# Altium schematic symbol library NXP_60_26022015.SCHLIB: 1306 symbols (part 16 of 28) (continued)
## LPC1850FET180 (continued)
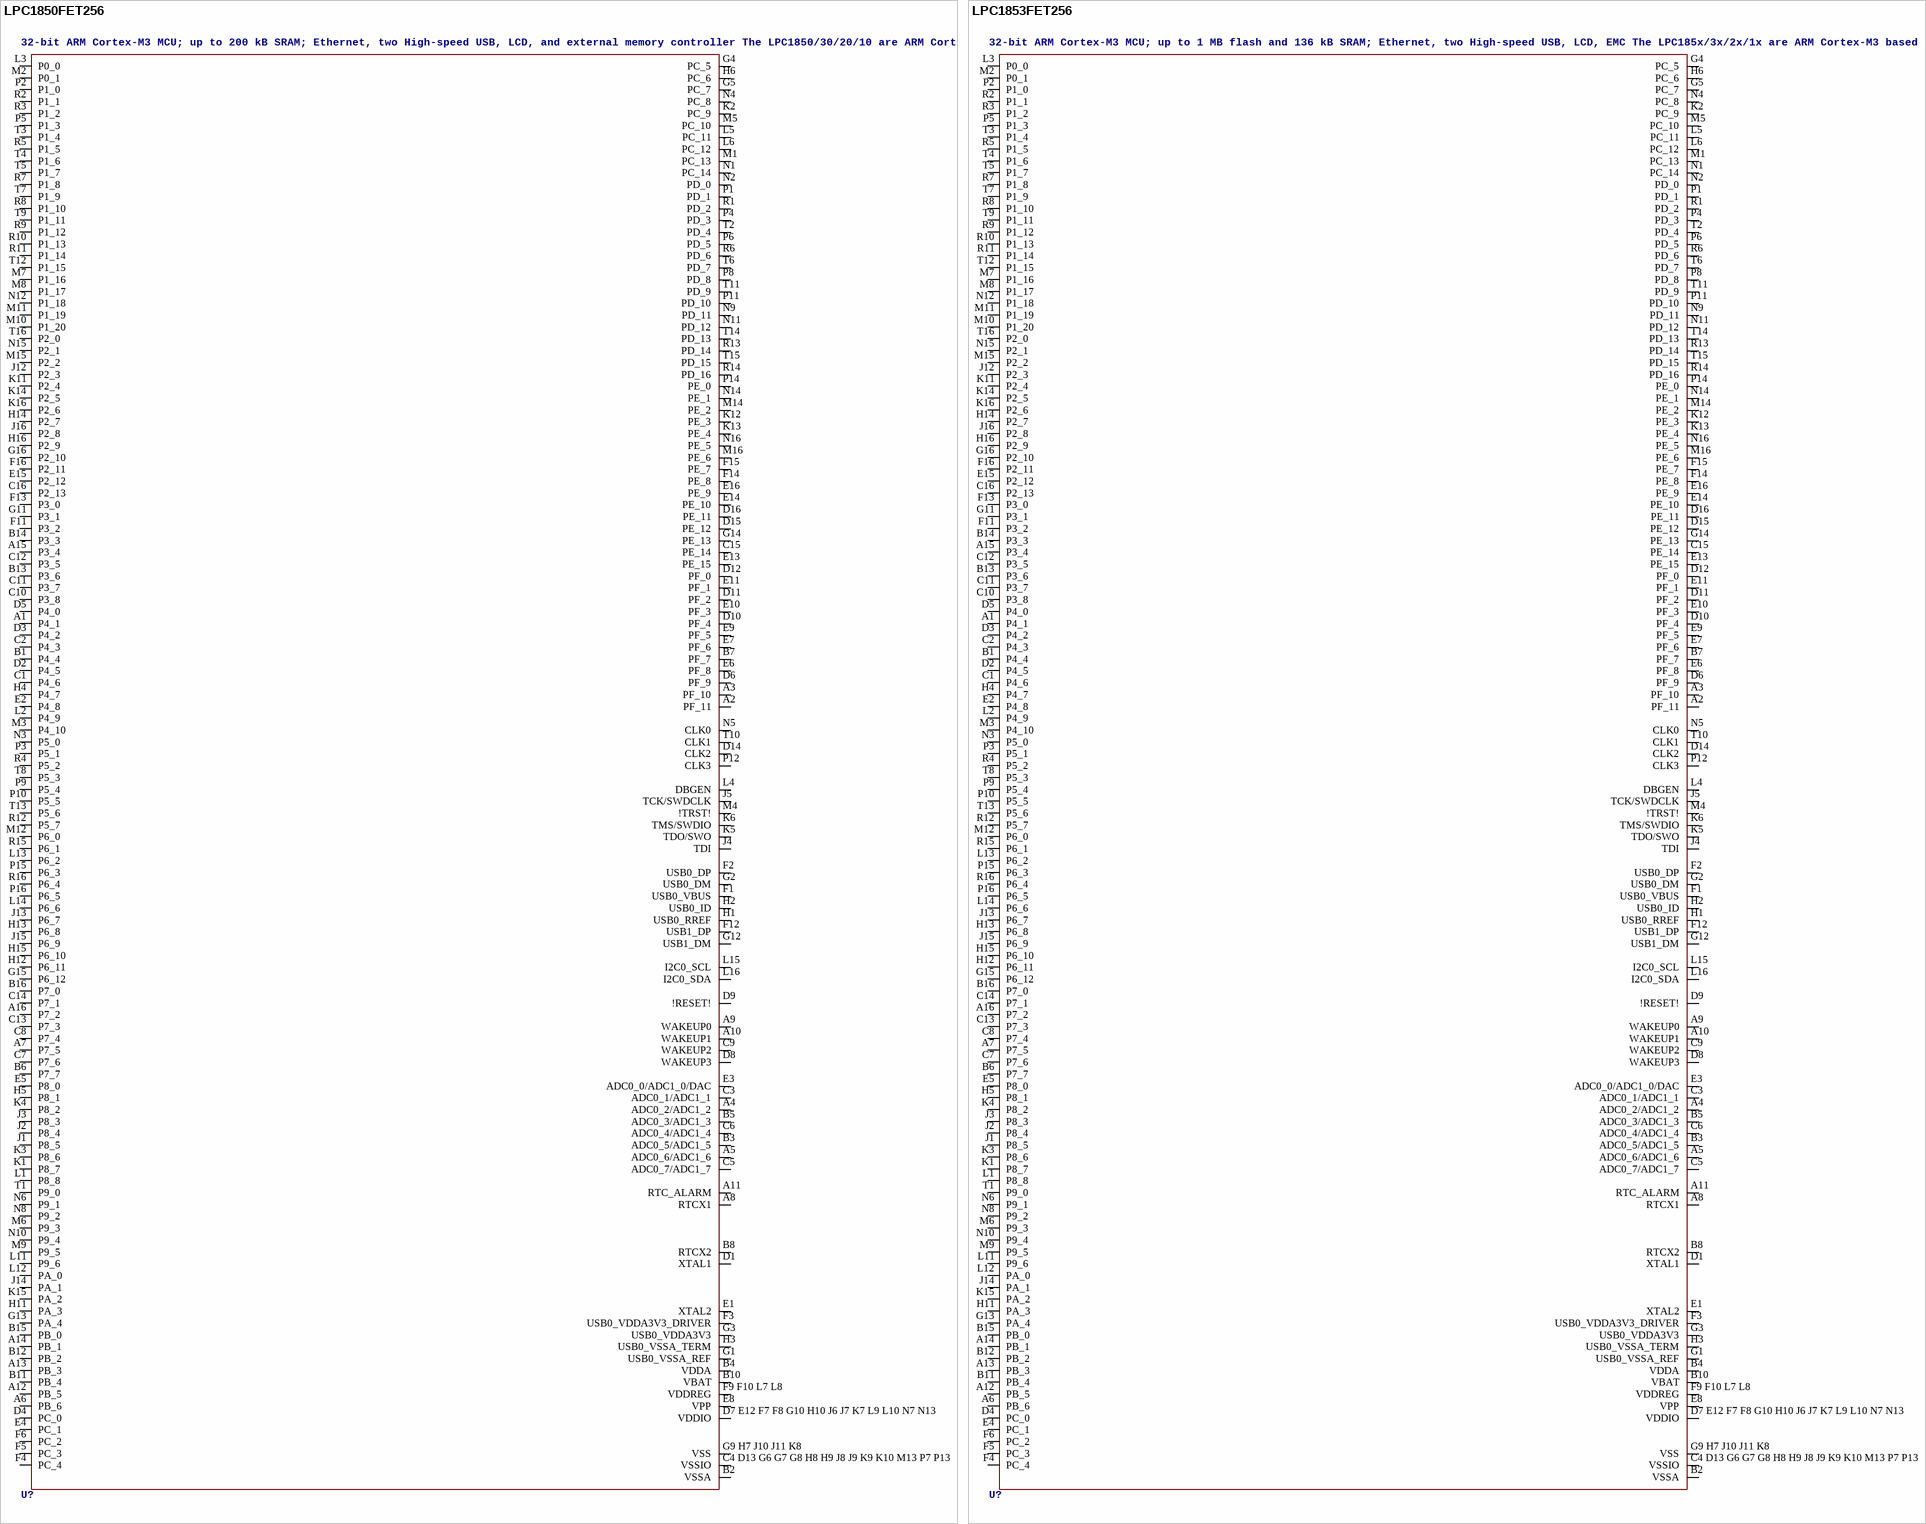
[diagram p105: symbols LPC1850FET256 to LPC1853FET256]

## LPC1850FET256
designator U?, comment 32-bit ARM Cortex-M3 MCU; up to 200 kB SRAM; Ethernet, two High-speed USB, LCD, and external memory controller The LPC1850/30/20/10 are ARM Cortex-M3 based microcontrollers for embedded applications. The ARM Cortex-M3 is a next generation core that offers system enhancements such as low power consumption, enhanced debug features, and a high level of support block integration. The LPC1850/30/20/10 operate at CPU frequencies of up to 180 MHz. The ARM Cortex-M3 CPU incorporates a 3-stage pipeline and uses a Harvard architecture with separate local instruction and data buses as well as a third bus for peripherals. The ARM Cortex-M3 CPU also includes an internal prefetch unit that supports speculative branching. The LPC1850/30/20/10 include up to 200 kB of on-chip SRAM, a quad SPI Flash Interface (SPIFI), a State Configurable Timer (SCT) subsystem, two High-speed USB controllers, Ethernet, LCD, an external memory controller, and multiple digital and analog peripherals.    AAL Eindhoven MK
ADC: 8; ETHERNET: yes; GPIO: 164; SRAM: 200kB; USB0: Host/OTG; USB1: Host/ULPI; LCD: yes; PWM: yes; QEI: yes
footprint SOT740-2
pins: A1 P4_1, A2 PF_11, A3 PF_10, A4 ADC0_2/ADC1_2, A5 ADC0_6/ADC1_6, A6 PB_6, A7 P7_5, A8 RTCX1, A9 WAKEUP0, A10 WAKEUP1, A11 RTC_ALARM, A12 PB_5, A13 PB_3, A14 PB_1, A15 P3_4, A16 P7_2, B1 P4_4, B2 VSSA, B3 ADC0_5/ADC1_5, B4 VDDA, B5 ADC0_3/ADC1_3, B6 P7_7, B7 PF_7, B8 RTCX2, B10 VBAT, B11 PB_4, B12 PB_2, B13 P3_6, B14 P3_3, B15 PB_0, B16 P7_0, C1 P4_6, C2 P4_3, C3 ADC0_1/ADC1_1, C4 D13 G6 G7 G8 H8 H9 J8 J9 K9 K10 M13 P7 P13 VSSIO, C5 ADC0_7/ADC1_7, C6 ADC0_4/ADC1_4, C7 P7_6, C8 P7_4, C9 WAKEUP2, C10 P3_8, C11 P3_7, C12 P3_5, C13 P7_3, C14 P7_1, C15 PE_14, C16 P2_13, D1 XTAL1, D2 P4_5, D3 P4_2, D4 PC_0, D5 P4_0, D6 PF_9, D7 E12 F7 F8 G10 H10 J6 J7 K7 L9 L10 N7 N13 VDDIO, D8 WAKEUP3, D9 !RESET!, D10 PF_4, D11 PF_2, D12 PF_0, D14 CLK2, D15 PE_12, D16 PE_11, E1 XTAL2, E2 P4_8, E3 ADC0_0/ADC1_0/DAC, E4 PC_1, E5 P8_0, E6 PF_8, E7 PF_6, E8 VPP, E9 PF_5, E10 PF_3, E11 PF_1, E13 PE_15, E14 PE_10, E15 P2_12, E16 PE_9, F1 USB0_VBUS, F2 USB0_DP, F3 USB0_VDDA3V3_DRIVER, F4 PC_4, F5 PC_3, F6 PC_2, F9 F10 L7 L8 VDDREG, F11 P3_2, F12 USB1_DP, F13 P3_0, F14 PE_8, F15 PE_7, F16 P2_11, G1 USB0_VSSA_REF, G2 USB0_DM, G3 USB0_VDDA3V3, G4 PC_5, G5 PC_7, G9 H7 J10 J11 K8 VSS, G11 P3_1, G12 USB1_DM, G13 PA_4, G14 PE_13, G15 P6_12, G16 P2_10, H1 USB0_RREF, H2 USB0_ID, H3 USB0_VSSA_TERM, H4 P4_7, H5 P8_1, H6 PC_6, H11 PA_3, H12 P6_11, H13 P6_8, H14 P2_7, H15 P6_10, H16 P2_9, J1 P8_5, J2 P8_4, J3 P8_3, J4 TDI, J5 TCK/SWDCLK, J12 P2_3, J13 P6_7, J14 PA_1, J15 P6_9, J16 P2_8, K1 P8_7, K2 PC_9, K3 P8_6, K4 P8_2, K5 TDO/SWO, K6 TMS/SWDIO, K11 P2_4, K12 PE_3, K13 PE_4, K14 P2_5, K15 PA_2, K16 P2_6, L1 P8_8, L2 P4_9, L3 P0_0, L4 DBGEN, L5 PC_11, L6 PC_12, L11 P9_6, L12 PA_0, L13 P6_2, L14 P6_6, L15 I2C0_SCL, L16 I2C0_SDA, M1 PC_13, M2 P0_1, M3 P4_10, M4 !TRST!, M5 PC_10, M6 P9_3, M7 P1_16, M8 P1_17, M9 P9_5, M10 P1_20, M11 P1_19, M12 P6_0, M14 PE_2, M15 P2_2, M16 PE_6, N1 PC_14, N2 PD_0, N3 P5_0, N4 PC_8, N5 CLK0, N6 P9_1, N8 P9_2, N9 PD_11, N10 P9_4, N11 PD_12, N12 P1_18, N14 PE_1, N15 P2_1, N16 PE_5, P1 PD_1, P2 P1_0, P3 P5_1, P4 PD_3, P5 P1_3, P6 PD_5, P8 PD_8, P9 P5_4, P10 P5_5, P11 PD_10, P12 CLK3, P14 PE_0, P15 P6_3, P16 P6_5, R1 PD_2, R2 P1_1, R3 P1_2, R4 P5_2, R5 P1_5, R6 PD_6, R7 P1_8, R8 P1_10, R9 P1_12, R10 P1_13, R11 P1_14, R12 P5_7, R13 PD_14, R14 PD_16, R15 P6_1, R16 P6_4, T1 P9_0, T2 PD_4, T3 P1_4, T4 P1_6, T5 P1_7, T6 PD_7, T7 P1_9, T8 P5_3, T9 P1_11, T10 CLK1, T11 PD_9, T12 P1_15, T13 P5_6, T14 PD_13, T15 PD_15, T16 P2_0

## LPC1853FET256
designator U?, comment 32-bit ARM Cortex-M3 MCU; up to 1 MB flash and 136 kB SRAM; Ethernet, two High-speed USB, LCD, EMC The LPC185x/3x/2x/1x are ARM Cortex-M3 based microcontrollers for embedded applications. The ARM Cortex-M3 is a next generation core that offers system enhancements such as low power consumption, enhanced debug features, and a high level of support block integration. The LPC185x/3x/2x/1x operate at CPU frequencies of up to 180 MHz. The ARM Cortex-M3 CPU incorporates a 3-stage pipeline and uses a Harvard architecture with separate local instruction and data buses as well as a third bus for peripherals. The ARM Cortex-M3 CPU also includes an internal prefetch unit that supports speculative branching. The LPC185x/3x/2x/1x include up to 1 MB of flash and 136 kB of on-chip SRAM, 16 kB of EEPROM memory, a quad SPI Flash Interface (SPIFI), a State Configurable Timer (SCT) subsystem, two High-speed USB controllers, Ethernet, LCD, an external memory controller, and multiple digital and analog peripherals.    AAL Eindhoven MK
ADC: 8; ETHERNET: yes; FLASH: 512kB; GPIO: 164; SRAM: 136kB; TEMPERATURE_RANGE: -40 °C to +85 °C; USB0: Host/OTG; USB1: Host/ULPI; LCD: yes; PWM: yes; QEI: yes
footprint SOT740-2
pins: A1 P4_1, A2 PF_11, A3 PF_10, A4 ADC0_2/ADC1_2, A5 ADC0_6/ADC1_6, A6 PB_6, A7 P7_5, A8 RTCX1, A9 WAKEUP0, A10 WAKEUP1, A11 RTC_ALARM, A12 PB_5, A13 PB_3, A14 PB_1, A15 P3_4, A16 P7_2, B1 P4_4, B2 VSSA, B3 ADC0_5/ADC1_5, B4 VDDA, B5 ADC0_3/ADC1_3, B6 P7_7, B7 PF_7, B8 RTCX2, B10 VBAT, B11 PB_4, B12 PB_2, B13 P3_6, B14 P3_3, B15 PB_0, B16 P7_0, C1 P4_6, C2 P4_3, C3 ADC0_1/ADC1_1, C4 D13 G6 G7 G8 H8 H9 J8 J9 K9 K10 M13 P7 P13 VSSIO, C5 ADC0_7/ADC1_7, C6 ADC0_4/ADC1_4, C7 P7_6, C8 P7_4, C9 WAKEUP2, C10 P3_8, C11 P3_7, C12 P3_5, C13 P7_3, C14 P7_1, C15 PE_14, C16 P2_13, D1 XTAL1, D2 P4_5, D3 P4_2, D4 PC_0, D5 P4_0, D6 PF_9, D7 E12 F7 F8 G10 H10 J6 J7 K7 L9 L10 N7 N13 VDDIO, D8 WAKEUP3, D9 !RESET!, D10 PF_4, D11 PF_2, D12 PF_0, D14 CLK2, D15 PE_12, D16 PE_11, E1 XTAL2, E2 P4_8, E3 ADC0_0/ADC1_0/DAC, E4 PC_1, E5 P8_0, E6 PF_8, E7 PF_6, E8 VPP, E9 PF_5, E10 PF_3, E11 PF_1, E13 PE_15, E14 PE_10, E15 P2_12, E16 PE_9, F1 USB0_VBUS, F2 USB0_DP, F3 USB0_VDDA3V3_DRIVER, F4 PC_4, F5 PC_3, F6 PC_2, F9 F10 L7 L8 VDDREG, F11 P3_2, F12 USB1_DP, F13 P3_0, F14 PE_8, F15 PE_7, F16 P2_11, G1 USB0_VSSA_REF, G2 USB0_DM, G3 USB0_VDDA3V3, G4 PC_5, G5 PC_7, G9 H7 J10 J11 K8 VSS, G11 P3_1, G12 USB1_DM, G13 PA_4, G14 PE_13, G15 P6_12, G16 P2_10, H1 USB0_RREF, H2 USB0_ID, H3 USB0_VSSA_TERM, H4 P4_7, H5 P8_1, H6 PC_6, H11 PA_3, H12 P6_11, H13 P6_8, H14 P2_7, H15 P6_10, H16 P2_9, J1 P8_5, J2 P8_4, J3 P8_3, J4 TDI, J5 TCK/SWDCLK, J12 P2_3, J13 P6_7, J14 PA_1, J15 P6_9, J16 P2_8, K1 P8_7, K2 PC_9, K3 P8_6, K4 P8_2, K5 TDO/SWO, K6 TMS/SWDIO, K11 P2_4, K12 PE_3, K13 PE_4, K14 P2_5, K15 PA_2, K16 P2_6, L1 P8_8, L2 P4_9, L3 P0_0, L4 DBGEN, L5 PC_11, L6 PC_12, L11 P9_6, L12 PA_0, L13 P6_2, L14 P6_6, L15 I2C0_SCL, L16 I2C0_SDA, M1 PC_13, M2 P0_1, M3 P4_10, M4 !TRST!, M5 PC_10, M6 P9_3, M7 P1_16, M8 P1_17, M9 P9_5, M10 P1_20, M11 P1_19, M12 P6_0, M14 PE_2, M15 P2_2, M16 PE_6, N1 PC_14, N2 PD_0, N3 P5_0, N4 PC_8, N5 CLK0, N6 P9_1, N8 P9_2, N9 PD_11, N10 P9_4, N11 PD_12, N12 P1_18, N14 PE_1, N15 P2_1, N16 PE_5, P1 PD_1, P2 P1_0, P3 P5_1, P4 PD_3, P5 P1_3, P6 PD_5, P8 PD_8, P9 P5_4, P10 P5_5, P11 PD_10, P12 CLK3, P14 PE_0, P15 P6_3, P16 P6_5, R1 PD_2, R2 P1_1, R3 P1_2, R4 P5_2, R5 P1_5, R6 PD_6, R7 P1_8, R8 P1_10, R9 P1_12, R10 P1_13, R11 P1_14, R12 P5_7, R13 PD_14, R14 PD_16, R15 P6_1, R16 P6_4, T1 P9_0, T2 PD_4, T3 P1_4, T4 P1_6, T5 P1_7, T6 PD_7, T7 P1_9, T8 P5_3, T9 P1_11, T10 CLK1, T11 PD_9, T12 P1_15, T13 P5_6, T14 PD_13, T15 PD_15, T16 P2_0

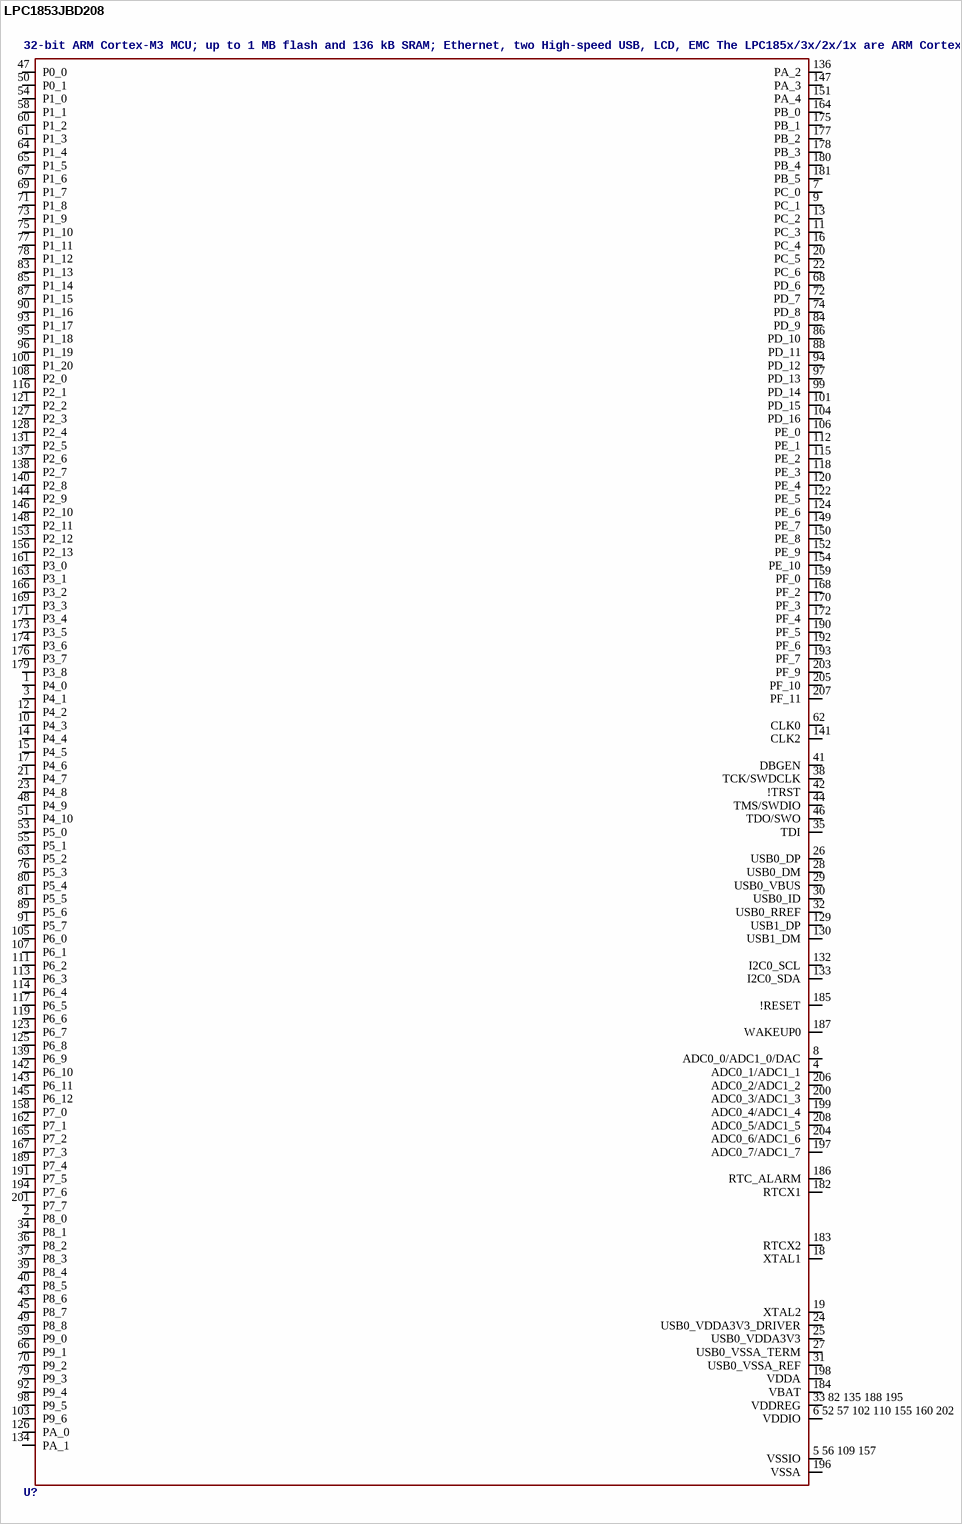
[diagram p106: symbol LPC1853JBD208]

## LPC1853JBD208
designator U?, comment 32-bit ARM Cortex-M3 MCU; up to 1 MB flash and 136 kB SRAM; Ethernet, two High-speed USB, LCD, EMC The LPC185x/3x/2x/1x are ARM Cortex-M3 based microcontrollers for embedded applications. The ARM Cortex-M3 is a next generation core that offers system enhancements such as low power consumption, enhanced debug features, and a high level of support block integration. The LPC185x/3x/2x/1x operate at CPU frequencies of up to 180 MHz. The ARM Cortex-M3 CPU incorporates a 3-stage pipeline and uses a Harvard architecture with separate local instruction and data buses as well as a third bus for peripherals. The ARM Cortex-M3 CPU also includes an internal prefetch unit that supports speculative branching. The LPC185x/3x/2x/1x include up to 1 MB of flash and 136 kB of on-chip SRAM, 16 kB of EEPROM memory, a quad SPI Flash Interface (SPIFI), a State Configurable Timer (SCT) subsystem, two High-speed USB controllers, Ethernet, LCD, an external memory controller, and multiple digital and analog peripherals.    AAL Eindhoven MK
ADC: 8; ETHERNET: yes; FLASH: 512kB; GPIO: 142; LCD: no; SRAM: 136kB; TEMPERATURE_RANGE: -40 °C to +105 °C; USB0: Host/OTG; USB1: Host/ULPI; PWM: yes; QEI: yes
footprint SOT459-1
pins: 1 P4_0, 2 P8_0, 3 P4_1, 4 ADC0_1/ADC1_1, 5 56 109 157 VSSIO, 6 52 57 102 110 155 160 202 VDDIO, 7 PC_0, 8 ADC0_0/ADC1_0/DAC, 9 PC_1, 10 P4_3, 11 PC_3, 12 P4_2, 13 PC_2, 14 P4_4, 15 P4_5, 16 PC_4, 17 P4_6, 18 XTAL1, 19 XTAL2, 20 PC_5, 21 P4_7, 22 PC_6, 23 P4_8, 24 USB0_VDDA3V3_DRIVER, 25 USB0_VDDA3V3, 26 USB0_DP, 27 USB0_VSSA_TERM, 28 USB0_DM, 29 USB0_VBUS, 30 USB0_ID, 31 USB0_VSSA_REF, 32 USB0_RREF, 33 82 135 188 195 VDDREG, 34 P8_1, 35 TDI, 36 P8_2, 37 P8_3, 38 TCK/SWDCLK, 39 P8_4, 40 P8_5, 41 DBGEN, 42 !TRST, 43 P8_6, 44 TMS/SWDIO, 45 P8_7, 46 TDO/SWO, 47 P0_0, 48 P4_9, 49 P8_8, 50 P0_1, 51 P4_10, 53 P5_0, 54 P1_0, 55 P5_1, 58 P1_1, 59 P9_0, 60 P1_2, 61 P1_3, 62 CLK0, 63 P5_2, 64 P1_4, 65 P1_5, 66 P9_1, 67 P1_6, 68 PD_6, 69 P1_7, 70 P9_2, 71 P1_8, 72 PD_7, 73 P1_9, 74 PD_8, 75 P1_10, 76 P5_3, 77 P1_11, 78 P1_12, 79 P9_3, 80 P5_4, 81 P5_5, 83 P1_13, 84 PD_9, 85 P1_14, 86 PD_10, 87 P1_15, 88 PD_11, 89 P5_6, 90 P1_16, 91 P5_7, 92 P9_4, 93 P1_17, 94 PD_12, 95 P1_18, 96 P1_19, 97 PD_13, 98 P9_5, 99 PD_14, 100 P1_20, 101 PD_15, 103 P9_6, 104 PD_16, 105 P6_0, 106 PE_0, 107 P6_1, 108 P2_0, 111 P6_2, 112 PE_1, 113 P6_3, 114 P6_4, 115 PE_2, 116 P2_1, 117 P6_5, 118 PE_3, 119 P6_6, 120 PE_4, 121 P2_2, 122 PE_5, 123 P6_7, 124 PE_6, 125 P6_8, 126 PA_0, 127 P2_3, 128 P2_4, 129 USB1_DP, 130 USB1_DM, 131 P2_5, 132 I2C0_SCL, 133 I2C0_SDA, 134 PA_1, 136 PA_2, 137 P2_6, 138 P2_7, 139 P6_9, 140 P2_8, 141 CLK2, 142 P6_10, 143 P6_11, 144 P2_9, 145 P6_12, 146 P2_10, 147 PA_3, 148 P2_11, 149 PE_7, 150 PE_8, 151 PA_4, 152 PE_9, 153 P2_12, 154 PE_10, 156 P2_13, 158 P7_0, 159 PF_0, 161 P3_0, 162 P7_1, 163 P3_1, 164 PB_0, 165 P7_2, 166 P3_2, 167 P7_3, 168 PF_2, 169 P3_3, 170 PF_3, 171 P3_4, 172 PF_4, 173 P3_5, 174 P3_6, 175 PB_1, 176 P3_7, 177 PB_2, 178 PB_3, 179 P3_8, 180 PB_4, 181 PB_5, 182 RTCX1, 183 RTCX2, 184 VBAT, 185 !RESET, 186 RTC_ALARM, 187 WAKEUP0, 189 P7_4, 190 PF_5, 191 P7_5, 192 PF_6, 193 PF_7, 194 P7_6, 196 VSSA, 197 ADC0_7/ADC1_7, 198 VDDA, 199 ADC0_4/ADC1_4, 200 ADC0_3/ADC1_3, 201 P7_7, 203 PF_9, 204 ADC0_6/ADC1_6, 205 PF_10, 206 ADC0_2/ADC1_2, 207 PF_11, 208 ADC0_5/ADC1_5

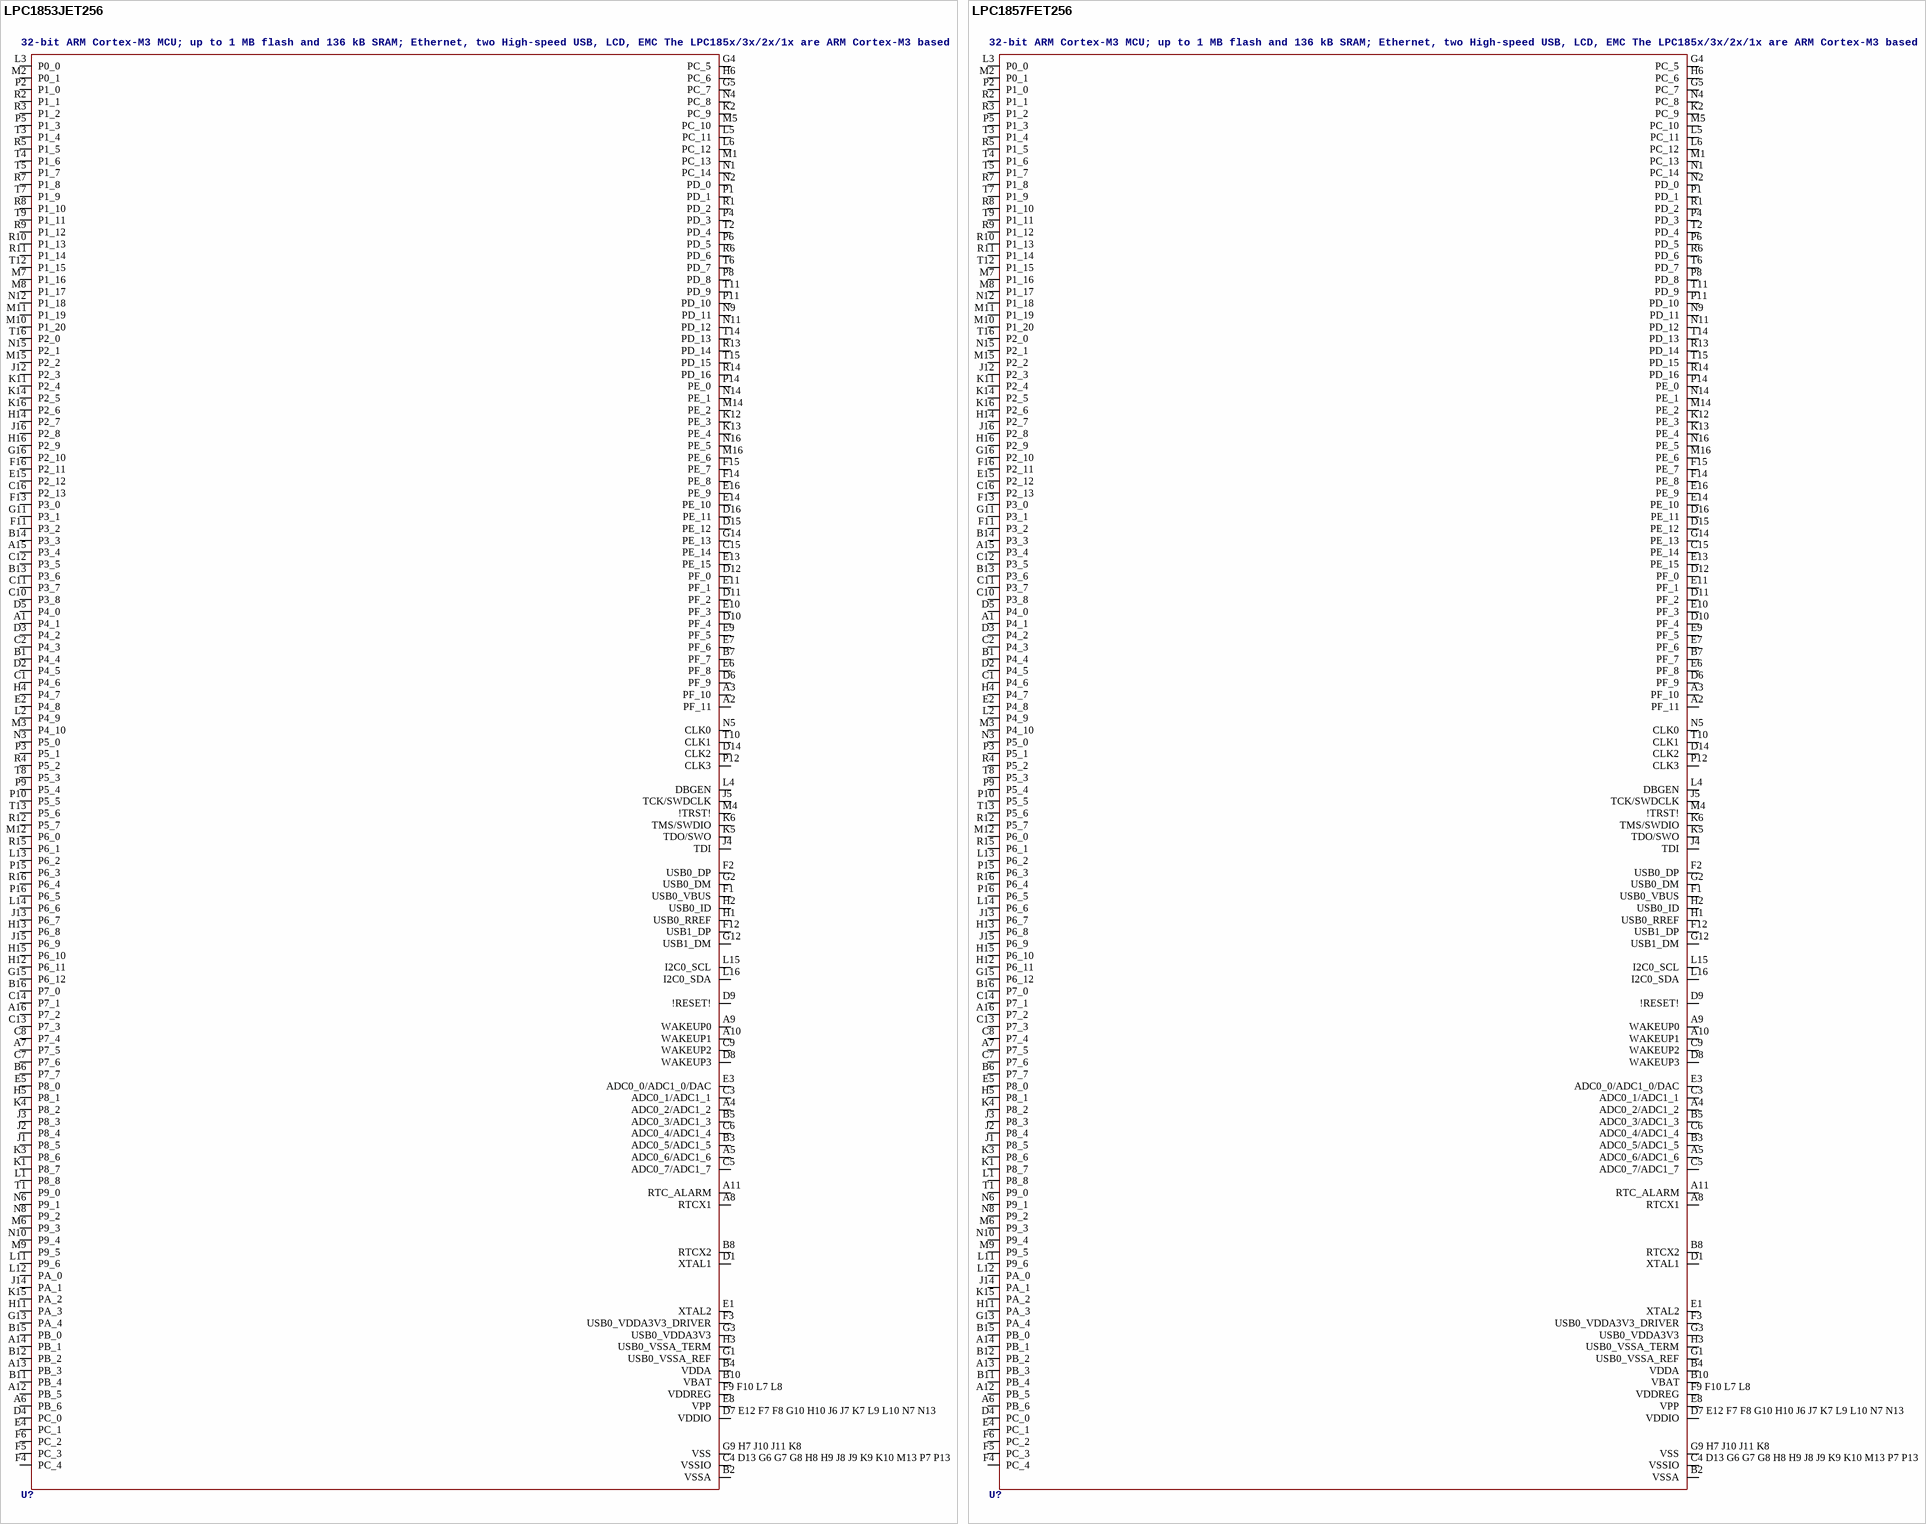
[diagram p107: symbols LPC1853JET256 to LPC1857FET256]
